# Altium footprint library IDETEC.PcbLib: 275 footprints (part 18 of 18)
Each footprint in its own frame and in the unit in brackets; x right, y up, seen from the top. Pads: shape width x height; smd on the part's side, far side on the other; paste and mask are expansions set on the pad; w line width, h text height; cw(c..) or ccw(c..) is an arc to the next point about the centre after c.
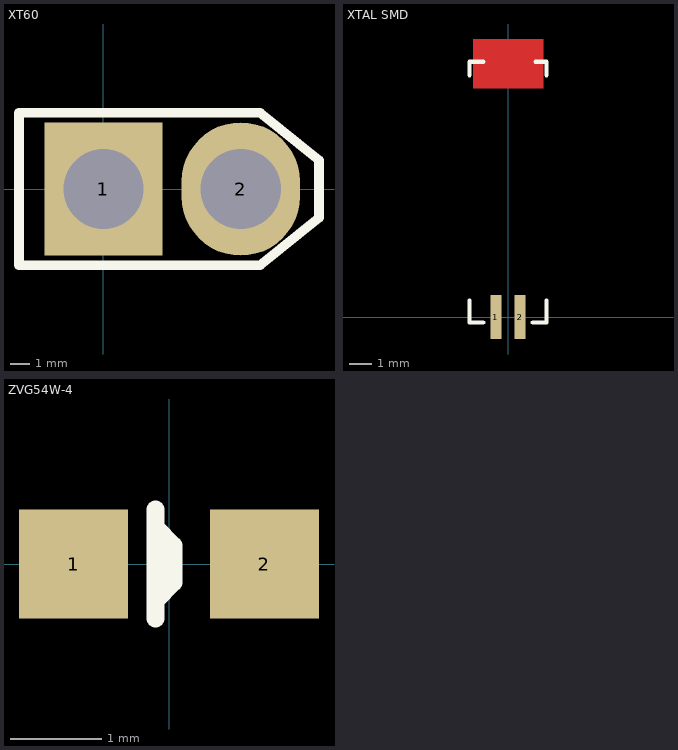
[diagram p17: the footprints below, top view; thin cyan lines are the x and y axes]

## XT60 [mm]
pads (2):
  rect 6.2x7 hole 4.2: 1(0,0)
  oval 6.2x7 hole 4.2: 2(7.2,0)
Top Overlay:
  lines w0.5: -4.429,-4 8.217,-4 11.306,-1.504 11.306,0 11.306,1.504 8.217,4 -4.429,4 -4.429,-4
3D body "User Library-XT60 male.STEP": height 16.5, standoff -4.7, extent -4.4,-4.058 11.5,4.092

## XTAL SMD [mm] "FOX Electronics, Micro Miniature \"AT STRIP\" Crystal 10.5 x Ø3.2mm"
height 3.2
pads (2):
  rect 0.5x2 smd: 1(-0.55,0) 2(0.55,0)
Top Layer:
  rectangle: -1.597,10.394 1.605,12.652
Top Overlay:
  lines w0.2: -1.75,0.75 -1.75,-0.25 -1.125,-0.25 ; -1.75,11 -1.75,11.625 -1.125,11.625 ; 1.125,-0.25 1.75,-0.25 1.75,0.75 ; 1.25,11.625 1.75,11.625 1.75,11
3D body "FOX FX-3_4MHz and Below.STEP": height 3.2, standoff -5.4, extent -1.6,-0.16 1.6,11.5

## ZVG54W-4 [mm] "2.0x1.25mmx0.4mm SMD CHIP LED LAMP"
height 0.4
pads (2):
  rect 1.2x1.2 smd: 1(-1.05,0) 2(1.05,0)
Top Overlay:
  lines w0.2: -0.15,-0.6 -0.15,0.6 ; -0.15,-0.4 0.05,-0.2 0.05,0.2 -0.15,0.4
3D body "ZVG54W-4.STEP": height 0.4, standoff 0, extent -1.05,-0.625 0.95,0.625